# Altium footprint library lib_protel_HC_BOINA.PCBLIB: 726 footprints (part 2 of 46)
Each footprint in its own frame and in the unit in brackets; x right, y up, seen from the top. Pads: shape width x height; smd on the part's side, far side on the other; paste and mask are expansions set on the pad; w line width, h text height; cw(c..) or ccw(c..) is an arc to the next point about the centre after c.
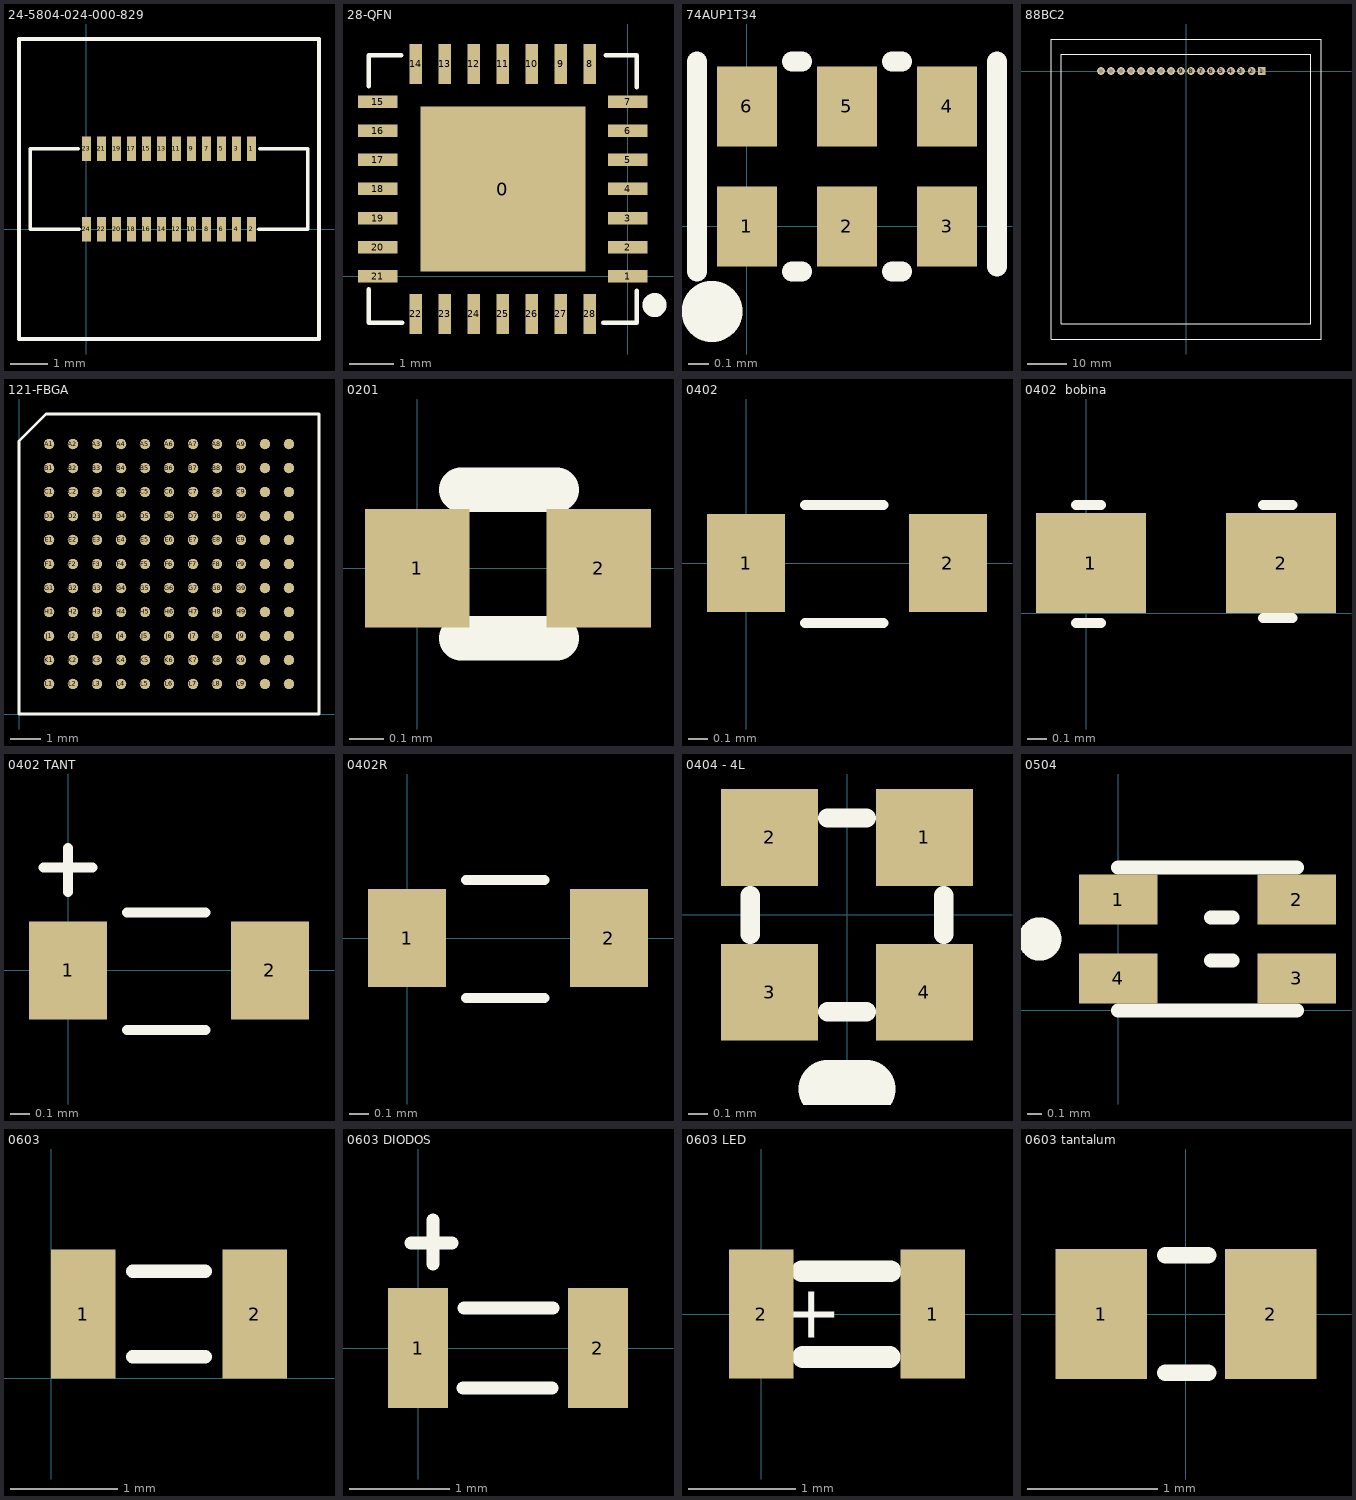
[diagram p1: the footprints below, top view; thin cyan lines are the x and y axes]

## 24-5804-024-000-829 [mm] "conector receptacle"
height 0.85
pads (24):
  rect 0.23x0.65 smd mask+0.05: 1(4.4,2.15) 2(4.4,0) 3(4,2.15) 4(4,0) 5(3.6,2.15) 6(3.6,0) 7(3.2,2.15) 8(3.2,0) 9(2.8,2.15) 10(2.8,0) 11(2.4,2.15) 12(2.4,0) 13(2,2.15) 14(2,0) 15(1.6,2.15) 16(1.6,0) 17(1.2,2.15) 18(1.2,0) 19(0.8,2.15) 20(0.8,0) 21(0.4,2.15) 22(0.4,0) 23(0,2.15) 24(0,0)
Top Overlay:
  lines w0.1: -0.225,2.15 -1.5,2.15 -1.5,0 -0.2,0 ; 4.6,0 5.9,0 5.9,2.15 4.625,2.15 ; -1.8,-2.925 -1.8,5.075 6.2,5.075 6.2,-2.925 -1.8,-2.925

## 28-QFN [mm] "28-QFN (23017)"
height 0.9
pads (29):
  rect 3.7x3.7 smd mask+0: 0(-2.8,1.95)
  rect 0.89x0.28 smd: 1(0,0) 2(0,0.65) 3(0,1.3) 4(0,1.95) 5(0,2.6) 6(0,3.25) 7(0,3.9) 15(-5.6,3.9) 16(-5.6,3.25) 17(-5.6,2.6) 18(-5.6,1.95) 19(-5.6,1.3) 20(-5.6,0.65) 21(-5.6,0)
  rect 0.28x0.89 smd: 8(-0.85,4.75) 9(-1.5,4.75) 10(-2.15,4.75) 11(-2.8,4.75) 12(-3.45,4.75) 13(-4.1,4.75) 14(-4.75,4.75) 22(-4.75,-0.85) 23(-4.1,-0.85) 24(-3.45,-0.85) 25(-2.8,-0.85) 26(-2.15,-0.85) 27(-1.5,-0.85) 28(-0.85,-0.85)
Top Overlay:
  circle w0.381: c0.598,-0.65 r0.077
  lines w0.1: -5.8,-0.3 -5.8,-1.05 ; -5.8,4.25 -5.8,4.95 ; -5.075,4.95 -5.8,4.95 ; -5.05,-1.05 -5.8,-1.05 ; -0.55,-1.05 0.2,-1.05 ; -0.5,4.95 0.2,4.95 ; 0.2,-0.325 0.2,-1.05 ; 0.2,4.225 0.2,4.95 ; -5.8,-1.05 -5.8,-1.05 ; -5.8,4.95 -5.8,4.95 ; 0.2,-1.05 0.2,-1.05 ; 0.2,4.95 0.2,4.95

## 74AUP1T34 [mm] "Level Shifter NXP"
height 0.5
pads (6):
  rect 0.3x0.4 smd mask+0.07: 1(0,0) 2(0.5,0) 3(1,0) 4(1,0.6) 5(0.5,0.6) 6(0,0.6)
Top Overlay:
  circle w0.254: c-0.175,-0.425 r0.025
  lines w0.1: -0.25,-0.225 -0.25,0.825 ; 0.225,-0.225 0.275,-0.225 ; 0.225,0.825 0.275,0.825 ; 0.725,-0.225 0.775,-0.225 ; 0.725,0.825 0.775,0.825 ; 1.25,-0.2 1.25,0.825
3D body "User Library-SOT886 (XSON6).STEP": height 0.46, standoff -0.04, extent -0.25,-0.225 1.25,0.825

## 88BC2 [mm] "Teclado Grayhill serie 88 de 4x4 Polo Simple"
height 9.14
pads (17):
  rect 2x2 hole 1: 1(19.25,0)
  round 2 hole 1: 2(16.71,0) 3(13.97,0) 4(11.43,0) 5(8.89,0) 6(6.35,0) 7(3.81,0) 8(1.27,0) 9(-1.27,0) 10(-3.81,0) 11(-6.35,0) 12(-8.89,0) 13(-11.43,0) 14(-13.97,0) 15(-16.51,0) 16(-19.05,0) 17(-21.59,0)
Top Overlay:
  lines w0.2: -34.29,-68.07 34.29,-68.07 34.29,8.13 -34.29,8.13 -34.29,-68.07 ; -31.625,-64.135 -31.625,4.195 31.625,4.195 31.625,-64.135 -31.625,-64.135

## 121-FBGA [mm] "121 BALL FBGA"
height 1.1
pads (121):
  round 0.35 smd mask+0.05: A1(1,9) A2(1.8,9) A3(2.6,9) A4(3.4,9) A5(4.2,9) A6(5,9) A7(5.8,9) A8(6.6,9) A9(7.4,9) A10(8.2,9) A11(9,9) B1(1,8.2) B2(1.8,8.2) B3(2.6,8.2) B4(3.4,8.2) B5(4.2,8.2) B6(5,8.2) B7(5.8,8.2) B8(6.6,8.2) B9(7.4,8.2) B10(8.2,8.2) B11(9,8.2) C1(1,7.4) C2(1.8,7.4) C3(2.6,7.4) C4(3.4,7.4) C5(4.2,7.4) C6(5,7.4) C7(5.8,7.4) C8(6.6,7.4) C9(7.4,7.4) C10(8.2,7.4) C11(9,7.4) D1(1,6.6) D2(1.8,6.6) D3(2.6,6.6) D4(3.4,6.6) D5(4.2,6.6) D6(5,6.6) D7(5.8,6.6) D8(6.6,6.6) D9(7.4,6.6) D10(8.2,6.6) D11(9,6.6) E1(1,5.8) E2(1.8,5.8) E3(2.6,5.8) E4(3.4,5.8) E5(4.2,5.8) E6(5,5.8) E7(5.8,5.8) E8(6.6,5.8) E9(7.4,5.8) E10(8.2,5.8) E11(9,5.8) F1(1,5) F2(1.8,5) F3(2.6,5) F4(3.4,5) F5(4.2,5) F6(5,5) F7(5.8,5) F8(6.6,5) F9(7.4,5) F10(8.2,5) F11(9,5) G1(1,4.2) G2(1.8,4.2) G3(2.6,4.2) G4(3.4,4.2) G5(4.2,4.2) G6(5,4.2) G7(5.8,4.2) G8(6.6,4.2) G9(7.4,4.2) G10(8.2,4.2) G11(9,4.2) H1(1,3.4) H2(1.8,3.4) H3(2.6,3.4) H4(3.4,3.4) H5(4.2,3.4) H6(5,3.4) H7(5.8,3.4) H8(6.6,3.4) H9(7.4,3.4) H10(8.2,3.4) H11(9,3.4) J1(1,2.6) J2(1.8,2.6) J3(2.6,2.6) J4(3.4,2.6) J5(4.2,2.6) J6(5,2.6) J7(5.8,2.6) J8(6.6,2.6) J9(7.4,2.6) J10(8.2,2.6) J11(9,2.6) K1(1,1.8) K2(1.8,1.8) K3(2.6,1.8) K4(3.4,1.8) K5(4.2,1.8) K6(5,1.8) K7(5.8,1.8) K8(6.6,1.8) K9(7.4,1.8) K10(8.2,1.8) K11(9,1.8) L1(1,1) L2(1.8,1) L3(2.6,1) L4(3.4,1) L5(4.2,1) L6(5,1) L7(5.8,1) L8(6.6,1) L9(7.4,1) L10(8.2,1) L11(9,1)
Top Overlay:
  lines w0.1: 0,0 10,0 10,10 0.9,10 0,9.1 0,0

## 0201 [mm]
pads (2):
  rect 0.3x0.34 smd: 1(0,0) 2(0.52,0)
Top Overlay:
  lines w0.127: 0.125,-0.2 0.4,-0.2 ; 0.125,0.225 0.4,0.225
3D body "User Library-smt_inductor-0201.step": height 0.26, standoff -0.01, extent -0.035,-0.16 0.585,0.16

## 0402 [mm] "encapsulado 0402 para R y C."
height 0.35
pads (2):
  rect 0.4x0.5 smd: 1(0,0) 2(1.03,0)
Top Overlay:
  lines w0.051: 0.3,-0.304 0.7,-0.304 ; 0.3,0.296 0.7,0.296
3D body "RESC1005X04N.step": height 0.35, standoff 0, extent 0.03,-0.25 1.03,0.25

## 0402  bobina [mil] "para bobina coilcraft zigbee"
height 26
pads (2):
  rect 22.01x20 smd: 1(0.98,10) 2(39.02,10)
Top Overlay:
  lines w2: -1.97,-1.97 2.95,-1.97 ; -1.97,21.65 2.95,21.65 ; 35.43,-0.98 41.34,-0.98 ; 35.43,21.65 41.34,21.65

## 0402 TANT [mm] "encapsulado 0402 para R y C. DE TANTALUM"
height 0.35
pads (2):
  rect 0.4x0.5 smd: 1(0,0) 2(1.03,0)
Top Overlay:
  lines w0.05: -0.125,0.525 0.125,0.525 ; 0,0.4 0,0.625
  lines w0.051: 0.3,-0.304 0.7,-0.304 ; 0.3,0.296 0.7,0.296
3D body "User Library-0402C.STEP": height 0.35, standoff 0, extent 0.03,-0.265 1.03,0.265

## 0402R [mm] "encapsulado 0402 REDUCIDO para R y C."
height 0.35
pads (2):
  rect 0.4x0.5 smd: 1(0,0) 2(1.03,0)
Top Overlay:
  lines w0.051: 0.3,-0.304 0.7,-0.304 ; 0.3,0.296 0.7,0.296
3D body "RES0402.STEP": height 0.35, standoff 0, extent 0.025,-0.255 1.025,0.255

## 0404 - 4L [mm]
height 0.2
pads (4):
  rect 0.5x0.5 smd: 1(0.4,0.4) 2(-0.4,0.4) 3(-0.4,-0.4) 4(0.4,-0.4)
Top Overlay:
  lines w0.1: -0.5,-0.1 -0.5,0.1 ; -0.1,-0.5 0.1,-0.5 ; -0.1,0.5 0.1,0.5 ; 0.5,-0.1 0.5,0.1
  lines w0.3: -0.1,-0.9 0.1,-0.9
3D body "SML-P24.STEP": height 0.2, standoff 0, extent -0.5,-0.5 0.5,0.5

## 0504 [mm] "DLP11S"
height 0.82
pads (4):
  rect 0.55x0.35 smd: 1(0,0.775) 2(1.25,0.775) 3(1.25,0.225) 4(0,0.225)
Top Overlay:
  circle w0.254: c-0.55,0.5 r0.025
  lines w0.1: 0,0 1.25,0 ; 0,1 1.25,1 ; 0.65,0.35 0.8,0.35 ; 0.65,0.65 0.8,0.65

## 0603 [mm]
pads (2):
  rect 0.6x1.2 smd: 1(0.3,0.6) 2(1.9,0.6)
Top Overlay:
  lines w0.127: 0.76,0.2 1.44,0.2 ; 0.76,1 1.44,1

## 0603 DIODOS [mm]
pads (2):
  rect 0.6x1.2 smd: 1(0,0) 2(1.8,0)
Top Overlay:
  lines w0.127: -0.07,1.05 0.34,1.05 ; 0.15,0.84 0.15,1.28 ; 0.45,-0.4 1.34,-0.4 ; 0.46,0.4 1.35,0.4

## 0603 LED [mm]
pads (2):
  rect 0.6x1.2 smd: 1(1.602,0.001) 2(0.002,0.001)
Top Overlay:
  lines w0.203: 0.38,0.4 1.21,0.4 ; 0.39,-0.4 1.2,-0.4
  text "+" at 0.76,-0.22 h0.5

## 0603 tantalum [mm]
pads (2):
  rect 0.7x1 smd: 1(-0.65,0) 2(0.65,0)
Top Overlay:
  lines w0.127: -0.16,-0.45 0.17,-0.45 ; -0.16,0.45 0.17,0.45